# Altium footprint library Conectores GAM.PcbLib: 182 footprints (part 3 of 12)
Each footprint in its own frame and in the unit in brackets; x right, y up, seen from the top. Pads: shape width x height; smd on the part's side, far side on the other; paste and mask are expansions set on the pad; w line width, h text height; cw(c..) or ccw(c..) is an arc to the next point about the centre after c.
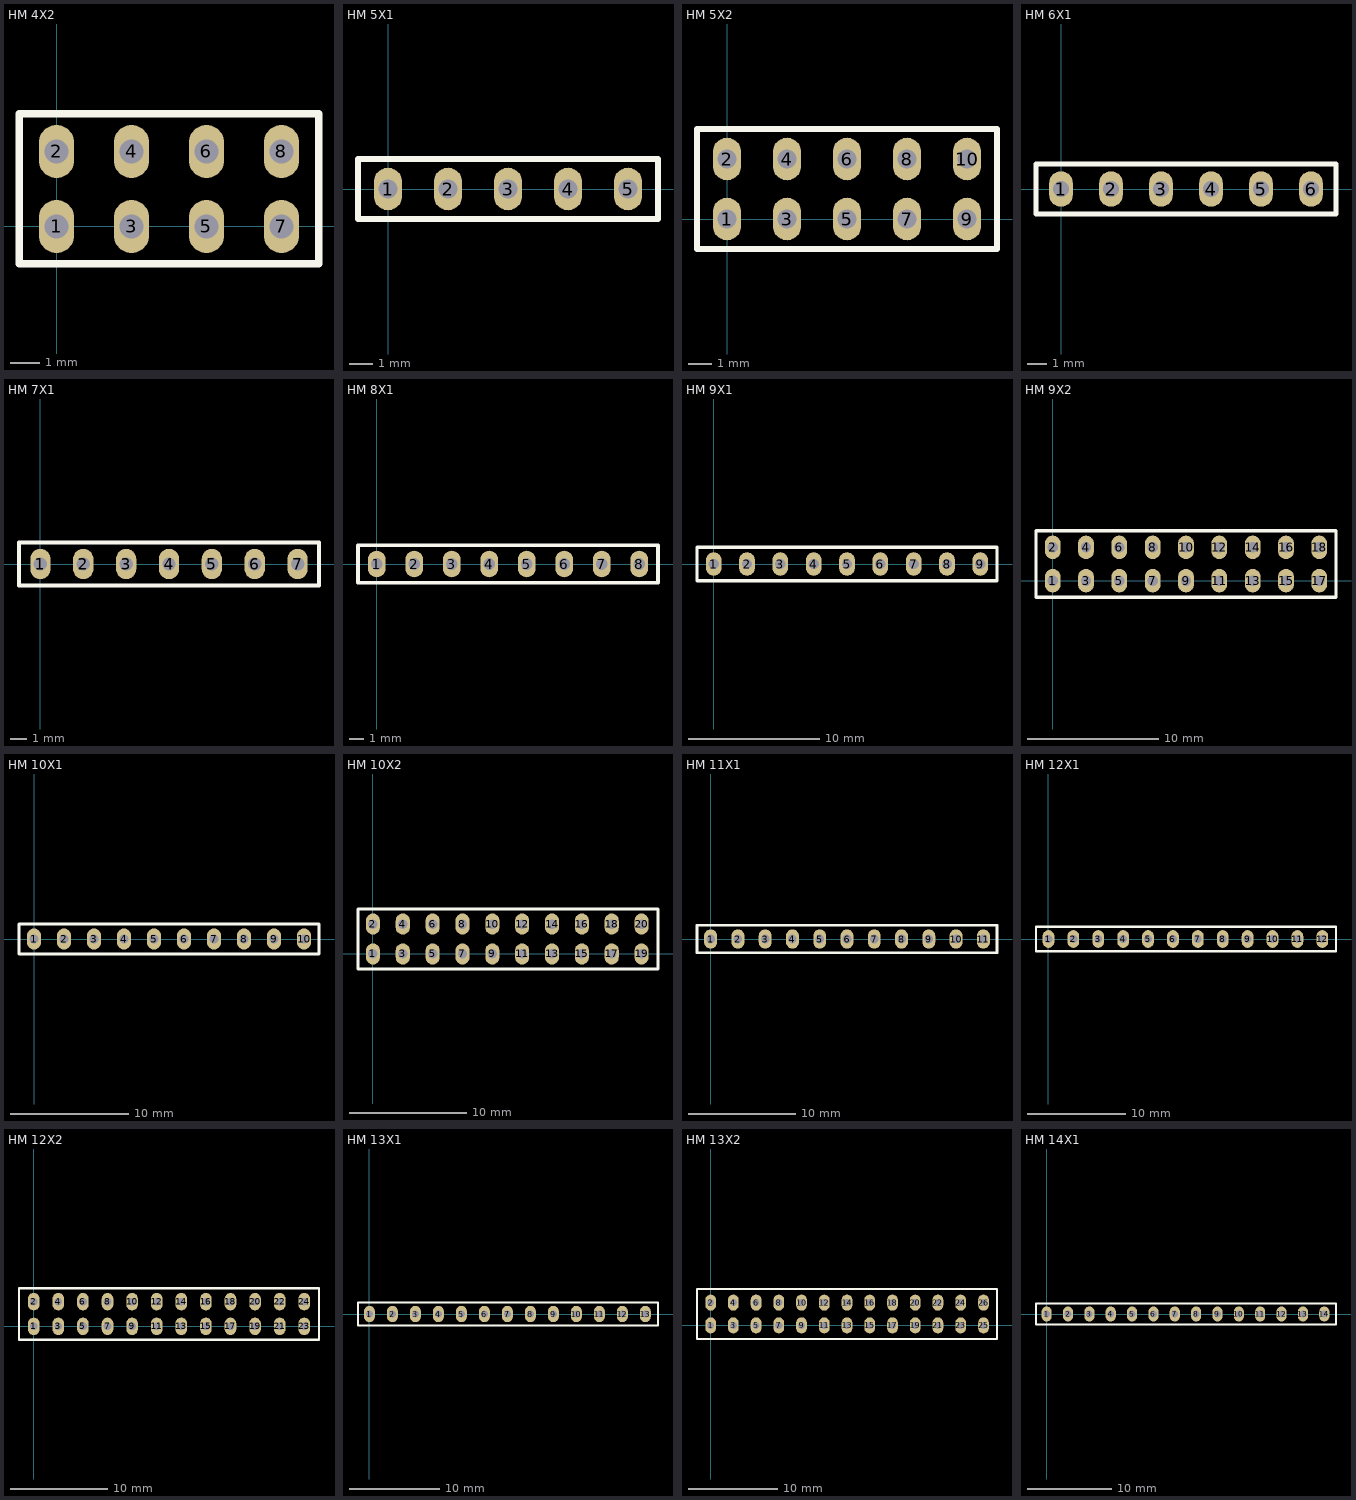
[diagram p2: the footprints below, top view; thin cyan lines are the x and y axes]

## HM 4X2 [mm] "Header Macho 4x2 2.54mm"
pads (8):
  oval 1.2x1.8 hole 0.8: 1(0,0) 2(0,2.54) 3(2.54,0) 4(2.54,2.54) 5(5.08,0) 6(5.08,2.54) 7(7.62,0) 8(7.62,2.54)
Top Overlay:
  lines w0.254: -1.27,-1.27 -1.27,1.27 -1.27,3.81 8.89,3.81 8.89,1.27 8.89,-1.27 -1.27,-1.27
3D body "Header_Male_1Pin.STEP": height 8.54, standoff -3, extent -1.27,-1.245 1.27,1.245
3D body "Header_Male_1Pin.STEP": height 8.54, standoff -3, extent 1.27,-1.245 3.81,1.245
3D body "Header_Male_1Pin.STEP": height 8.54, standoff -3, extent 3.81,-1.245 6.35,1.245
3D body "Header_Male_1Pin.STEP": height 8.54, standoff -3, extent 6.35,-1.245 8.89,1.245
3D body "Header_Male_1Pin.STEP": height 8.54, standoff -3, extent 6.35,1.295 8.89,3.785
3D body "Header_Male_1Pin.STEP": height 8.54, standoff -3, extent 3.81,1.295 6.35,3.785
3D body "Header_Male_1Pin.STEP": height 8.54, standoff -3, extent 1.27,1.295 3.81,3.785
3D body "Header_Male_1Pin.STEP": height 8.54, standoff -3, extent -1.27,1.295 1.27,3.785

## HM 5X1 [mm] "Header Macho 5x1 2.54mm"
pads (5):
  oval 1.2x1.8 hole 0.8: 1(0,0) 2(2.54,0) 3(5.08,0) 4(7.62,0) 5(10.16,0)
Top Overlay:
  lines w0.254: -1.27,-1.27 -1.27,1.27 11.43,1.27 11.43,-1.27 -1.27,-1.27
3D body "Header_Male_1Pin.STEP": height 8.54, standoff -3, extent -1.27,-1.245 1.27,1.245
3D body "Header_Male_1Pin.STEP": height 8.54, standoff -3, extent 1.27,-1.245 3.81,1.245
3D body "Header_Male_1Pin.STEP": height 8.54, standoff -3, extent 3.81,-1.245 6.35,1.245
3D body "Header_Male_1Pin.STEP": height 8.54, standoff -3, extent 6.35,-1.245 8.89,1.245
3D body "Header_Male_1Pin.STEP": height 8.54, standoff -3, extent 8.89,-1.245 11.43,1.245

## HM 5X2 [mm] "Header Macho 5x2 2.54mm"
pads (10):
  oval 1.2x1.8 hole 0.8: 1(0,0) 2(0,2.54) 3(2.54,0) 4(2.54,2.54) 5(5.08,0) 6(5.08,2.54) 7(7.62,0) 8(7.62,2.54) 9(10.16,0) 10(10.16,2.54)
Top Overlay:
  lines w0.254: -1.27,-1.27 11.43,-1.27 11.43,1.27 11.43,3.81 -1.27,3.81 -1.27,1.27 -1.27,-1.27
3D body "Header_Male_1Pin.STEP": height 8.54, standoff -3, extent 8.89,-1.245 11.43,1.245
3D body "Header_Male_1Pin.STEP": height 8.54, standoff -3, extent 6.35,-1.245 8.89,1.245
3D body "Header_Male_1Pin.STEP": height 8.54, standoff -3, extent 3.81,-1.245 6.35,1.245
3D body "Header_Male_1Pin.STEP": height 8.54, standoff -3, extent 1.27,-1.245 3.81,1.245
3D body "Header_Male_1Pin.STEP": height 8.54, standoff -3, extent -1.27,-1.245 1.27,1.245
3D body "Header_Male_1Pin.STEP": height 8.54, standoff -3, extent -1.27,1.295 1.27,3.785
3D body "Header_Male_1Pin.STEP": height 8.54, standoff -3, extent 1.27,1.295 3.81,3.785
3D body "Header_Male_1Pin.STEP": height 8.54, standoff -3, extent 3.81,1.295 6.35,3.785
3D body "Header_Male_1Pin.STEP": height 8.54, standoff -3, extent 6.35,1.295 8.89,3.785
3D body "Header_Male_1Pin.STEP": height 8.54, standoff -3, extent 8.89,1.295 11.43,3.785

## HM 6X1 [mm] "Header Macho 6x1 2.54mm"
pads (6):
  oval 1.2x1.8 hole 0.8: 1(0,0) 2(2.54,0) 3(5.08,0) 4(7.62,0) 5(10.16,0) 6(12.7,0)
Top Overlay:
  lines w0.254: -1.27,-1.27 -1.27,1.27 13.97,1.27 13.97,-1.27 -1.27,-1.27
3D body "Header_Male_1Pin.STEP": height 8.54, standoff -3, extent -1.27,-1.245 1.27,1.245
3D body "Header_Male_1Pin.STEP": height 8.54, standoff -3, extent 1.27,-1.245 3.81,1.245
3D body "Header_Male_1Pin.STEP": height 8.54, standoff -3, extent 3.81,-1.245 6.35,1.245
3D body "Header_Male_1Pin.STEP": height 8.54, standoff -3, extent 6.35,-1.245 8.89,1.245
3D body "Header_Male_1Pin.STEP": height 8.54, standoff -3, extent 8.89,-1.245 11.43,1.245
3D body "Header_Male_1Pin.STEP": height 8.54, standoff -3, extent 11.43,-1.245 13.97,1.245

## HM 7X1 [mm] "Header Macho 7x1 2.54mm"
pads (7):
  oval 1.2x1.8 hole 0.8: 1(0,0) 2(2.54,0) 3(5.08,0) 4(7.62,0) 5(10.16,0) 6(12.7,0) 7(15.24,0)
Top Overlay:
  lines w0.254: -1.27,-1.27 16.51,-1.27 16.51,1.27 -1.27,1.27 -1.27,-1.27
3D body "Header_Male_1Pin.STEP": height 8.54, standoff -3, extent 13.97,-1.245 16.51,1.245
3D body "Header_Male_1Pin.STEP": height 8.54, standoff -3, extent 11.43,-1.245 13.97,1.245
3D body "Header_Male_1Pin.STEP": height 8.54, standoff -3, extent 8.89,-1.245 11.43,1.245
3D body "Header_Male_1Pin.STEP": height 8.54, standoff -3, extent 6.35,-1.245 8.89,1.245
3D body "Header_Male_1Pin.STEP": height 8.54, standoff -3, extent 3.81,-1.245 6.35,1.245
3D body "Header_Male_1Pin.STEP": height 8.54, standoff -3, extent 1.27,-1.245 3.81,1.245
3D body "Header_Male_1Pin.STEP": height 8.54, standoff -3, extent -1.27,-1.245 1.27,1.245

## HM 8X1 [mm] "Header Macho 8x1 2.54mm"
pads (8):
  oval 1.2x1.8 hole 0.8: 1(0,0) 2(2.54,0) 3(5.08,0) 4(7.62,0) 5(10.16,0) 6(12.7,0) 7(15.24,0) 8(17.78,0)
Top Overlay:
  lines w0.254: -1.27,-1.27 19.05,-1.27 19.05,1.27 -1.27,1.27 -1.27,-1.27
3D body "Header_Male_1Pin.STEP": height 8.54, standoff -3, extent 16.51,-1.245 19.05,1.245
3D body "Header_Male_1Pin.STEP": height 8.54, standoff -3, extent 13.97,-1.245 16.51,1.245
3D body "Header_Male_1Pin.STEP": height 8.54, standoff -3, extent 11.43,-1.245 13.97,1.245
3D body "Header_Male_1Pin.STEP": height 8.54, standoff -3, extent 8.89,-1.245 11.43,1.245
3D body "Header_Male_1Pin.STEP": height 8.54, standoff -3, extent 6.35,-1.245 8.89,1.245
3D body "Header_Male_1Pin.STEP": height 8.54, standoff -3, extent 3.81,-1.245 6.35,1.245
3D body "Header_Male_1Pin.STEP": height 8.54, standoff -3, extent 1.27,-1.245 3.81,1.245
3D body "Header_Male_1Pin.STEP": height 8.54, standoff -3, extent -1.27,-1.245 1.27,1.245

## HM 9X1 [mm] "Header Macho 9x1 2.54mm"
pads (9):
  oval 1.2x1.8 hole 0.8: 1(0,0) 2(2.54,0) 3(5.08,0) 4(7.62,0) 5(10.16,0) 6(12.7,0) 7(15.24,0) 8(17.78,0) 9(20.32,0)
Top Overlay:
  lines w0.254: -1.27,-1.27 21.59,-1.27 21.59,1.27 -1.27,1.27 -1.27,-1.27
3D body "Header_Male_1Pin.STEP": height 8.54, standoff -3, extent 19.05,-1.245 21.59,1.245
3D body "Header_Male_1Pin.STEP": height 8.54, standoff -3, extent 16.51,-1.245 19.05,1.245
3D body "Header_Male_1Pin.STEP": height 8.54, standoff -3, extent 13.97,-1.245 16.51,1.245
3D body "Header_Male_1Pin.STEP": height 8.54, standoff -3, extent 11.43,-1.245 13.97,1.245
3D body "Header_Male_1Pin.STEP": height 8.54, standoff -3, extent 8.89,-1.245 11.43,1.245
3D body "Header_Male_1Pin.STEP": height 8.54, standoff -3, extent 6.35,-1.245 8.89,1.245
3D body "Header_Male_1Pin.STEP": height 8.54, standoff -3, extent 3.81,-1.245 6.35,1.245
3D body "Header_Male_1Pin.STEP": height 8.54, standoff -3, extent 1.27,-1.245 3.81,1.245
3D body "Header_Male_1Pin.STEP": height 8.54, standoff -3, extent -1.27,-1.245 1.27,1.245

## HM 9X2 [mm] "Header Macho 9x2 2.54mm"
pads (18):
  oval 1.2x1.8 hole 0.8: 1(0,0) 2(0,2.54) 3(2.54,0) 4(2.54,2.54) 5(5.08,0) 6(5.08,2.54) 7(7.62,0) 8(7.62,2.54) 9(10.16,0) 10(10.16,2.54) 11(12.7,0) 12(12.7,2.54) 13(15.24,0) 14(15.24,2.54) 15(17.78,0) 16(17.78,2.54) 17(20.32,0) 18(20.32,2.54)
Top Overlay:
  lines w0.254: -1.27,-1.27 -1.27,1.27 -1.27,3.81 21.59,3.81 21.59,1.27 21.59,-1.27 -1.27,-1.27
3D body "Header_Male_1Pin.STEP": height 8.54, standoff -3, extent 19.05,1.295 21.59,3.785
3D body "Header_Male_1Pin.STEP": height 8.54, standoff -3, extent 16.51,1.295 19.05,3.785
3D body "Header_Male_1Pin.STEP": height 8.54, standoff -3, extent 13.97,1.295 16.51,3.785
3D body "Header_Male_1Pin.STEP": height 8.54, standoff -3, extent 11.43,1.295 13.97,3.785
3D body "Header_Male_1Pin.STEP": height 8.54, standoff -3, extent 8.89,1.295 11.43,3.785
3D body "Header_Male_1Pin.STEP": height 8.54, standoff -3, extent 6.35,1.295 8.89,3.785
3D body "Header_Male_1Pin.STEP": height 8.54, standoff -3, extent 3.81,1.295 6.35,3.785
3D body "Header_Male_1Pin.STEP": height 8.54, standoff -3, extent 1.27,1.295 3.81,3.785
3D body "Header_Male_1Pin.STEP": height 8.54, standoff -3, extent -1.27,1.295 1.27,3.785
3D body "Header_Male_1Pin.STEP": height 8.54, standoff -3, extent -1.27,-1.245 1.27,1.245
3D body "Header_Male_1Pin.STEP": height 8.54, standoff -3, extent 1.27,-1.245 3.81,1.245
3D body "Header_Male_1Pin.STEP": height 8.54, standoff -3, extent 3.81,-1.245 6.35,1.245
3D body "Header_Male_1Pin.STEP": height 8.54, standoff -3, extent 6.35,-1.245 8.89,1.245
3D body "Header_Male_1Pin.STEP": height 8.54, standoff -3, extent 8.89,-1.245 11.43,1.245
3D body "Header_Male_1Pin.STEP": height 8.54, standoff -3, extent 11.43,-1.245 13.97,1.245
3D body "Header_Male_1Pin.STEP": height 8.54, standoff -3, extent 13.97,-1.245 16.51,1.245
3D body "Header_Male_1Pin.STEP": height 8.54, standoff -3, extent 16.51,-1.245 19.05,1.245
3D body "Header_Male_1Pin.STEP": height 8.54, standoff -3, extent 19.05,-1.245 21.59,1.245

## HM 10X1 [mm] "HM 10X1 2.54mm"
pads (10):
  oval 1.2x1.8 hole 0.8: 1(0,0) 2(2.54,0) 3(5.08,0) 4(7.62,0) 5(10.16,0) 6(12.7,0) 7(15.24,0) 8(17.78,0) 9(20.32,0) 10(22.86,0)
Top Overlay:
  lines w0.254: -1.27,-1.27 -1.27,1.27 24.13,1.27 24.13,-1.27 -1.27,-1.27
3D body "Header_Male_1Pin.STEP": height 8.54, standoff -3, extent -1.27,-1.245 1.27,1.245
3D body "Header_Male_1Pin.STEP": height 8.54, standoff -3, extent 1.27,-1.245 3.81,1.245
3D body "Header_Male_1Pin.STEP": height 8.54, standoff -3, extent 3.81,-1.245 6.35,1.245
3D body "Header_Male_1Pin.STEP": height 8.54, standoff -3, extent 6.35,-1.245 8.89,1.245
3D body "Header_Male_1Pin.STEP": height 8.54, standoff -3, extent 8.89,-1.245 11.43,1.245
3D body "Header_Male_1Pin.STEP": height 8.54, standoff -3, extent 11.43,-1.245 13.97,1.245
3D body "Header_Male_1Pin.STEP": height 8.54, standoff -3, extent 13.97,-1.245 16.51,1.245
3D body "Header_Male_1Pin.STEP": height 8.54, standoff -3, extent 16.51,-1.245 19.05,1.245
3D body "Header_Male_1Pin.STEP": height 8.54, standoff -3, extent 19.05,-1.245 21.59,1.245
3D body "Header_Male_1Pin.STEP": height 8.54, standoff -3, extent 21.59,-1.245 24.13,1.245

## HM 10X2 [mm] "HM 10X2 2.54mm"
pads (20):
  oval 1.2x1.8 hole 0.8: 1(0,0) 2(0,2.54) 3(2.54,0) 4(2.54,2.54) 5(5.08,0) 6(5.08,2.54) 7(7.62,0) 8(7.62,2.54) 9(10.16,0) 10(10.16,2.54) 11(12.7,0) 12(12.7,2.54) 13(15.24,0) 14(15.24,2.54) 15(17.78,0) 16(17.78,2.54) 17(20.32,0) 18(20.32,2.54) 19(22.86,0) 20(22.86,2.54)
Top Overlay:
  lines w0.254: -1.27,-1.27 -1.27,3.81 24.257,3.81 24.257,-1.27 -1.27,-1.27
3D body "Header_Male_1Pin.STEP": height 8.54, standoff -3, extent -1.27,-1.245 1.27,1.245
3D body "Header_Male_1Pin.STEP": height 8.54, standoff -3, extent 1.27,-1.245 3.81,1.245
3D body "Header_Male_1Pin.STEP": height 8.54, standoff -3, extent 3.81,-1.245 6.35,1.245
3D body "Header_Male_1Pin.STEP": height 8.54, standoff -3, extent 6.35,-1.245 8.89,1.245
3D body "Header_Male_1Pin.STEP": height 8.54, standoff -3, extent 8.89,-1.245 11.43,1.245
3D body "Header_Male_1Pin.STEP": height 8.54, standoff -3, extent 11.43,-1.245 13.97,1.245
3D body "Header_Male_1Pin.STEP": height 8.54, standoff -3, extent 13.97,-1.245 16.51,1.245
3D body "Header_Male_1Pin.STEP": height 8.54, standoff -3, extent 16.51,-1.245 19.05,1.245
3D body "Header_Male_1Pin.STEP": height 8.54, standoff -3, extent 19.05,-1.245 21.59,1.245
3D body "Header_Male_1Pin.STEP": height 8.54, standoff -3, extent 21.59,-1.245 24.13,1.245
3D body "Header_Male_1Pin.STEP": height 8.54, standoff -3, extent 21.59,1.295 24.13,3.785
3D body "Header_Male_1Pin.STEP": height 8.54, standoff -3, extent 19.05,1.295 21.59,3.785
3D body "Header_Male_1Pin.STEP": height 8.54, standoff -3, extent 16.51,1.295 19.05,3.785
3D body "Header_Male_1Pin.STEP": height 8.54, standoff -3, extent 13.97,1.295 16.51,3.785
3D body "Header_Male_1Pin.STEP": height 8.54, standoff -3, extent 11.43,1.295 13.97,3.785
3D body "Header_Male_1Pin.STEP": height 8.54, standoff -3, extent 8.89,1.295 11.43,3.785
3D body "Header_Male_1Pin.STEP": height 8.54, standoff -3, extent 6.35,1.295 8.89,3.785
3D body "Header_Male_1Pin.STEP": height 8.54, standoff -3, extent 3.81,1.295 6.35,3.785
3D body "Header_Male_1Pin.STEP": height 8.54, standoff -3, extent 1.27,1.295 3.81,3.785
3D body "Header_Male_1Pin.STEP": height 8.54, standoff -3, extent -1.27,1.295 1.27,3.785

## HM 11X1 [mm] "Header Macho 11x1 2.54mm"
pads (11):
  oval 1.2x1.8 hole 0.8: 1(0,0) 2(2.54,0) 3(5.08,0) 4(7.62,0) 5(10.16,0) 6(12.7,0) 7(15.24,0) 8(17.78,0) 9(20.32,0) 10(22.86,0) 11(25.4,0)
Top Overlay:
  lines w0.254: -1.27,-1.27 26.67,-1.27 26.67,1.27 -1.27,1.27 -1.27,-1.27
3D body "Header_Male_1Pin.STEP": height 8.54, standoff -3, extent 21.59,-1.245 24.13,1.245
3D body "Header_Male_1Pin.STEP": height 8.54, standoff -3, extent 19.05,-1.245 21.59,1.245
3D body "Header_Male_1Pin.STEP": height 8.54, standoff -3, extent 16.51,-1.245 19.05,1.245
3D body "Header_Male_1Pin.STEP": height 8.54, standoff -3, extent 13.97,-1.245 16.51,1.245
3D body "Header_Male_1Pin.STEP": height 8.54, standoff -3, extent 11.43,-1.245 13.97,1.245
3D body "Header_Male_1Pin.STEP": height 8.54, standoff -3, extent 8.89,-1.245 11.43,1.245
3D body "Header_Male_1Pin.STEP": height 8.54, standoff -3, extent 6.35,-1.245 8.89,1.245
3D body "Header_Male_1Pin.STEP": height 8.54, standoff -3, extent 3.81,-1.245 6.35,1.245
3D body "Header_Male_1Pin.STEP": height 8.54, standoff -3, extent 1.27,-1.245 3.81,1.245
3D body "Header_Male_1Pin.STEP": height 8.54, standoff -3, extent -1.27,-1.245 1.27,1.245
3D body "Header_Male_1Pin.STEP": height 8.54, standoff -3, extent 24.13,-1.245 26.67,1.245

## HM 12X1 [mm] "Header Macho 12x1 2.54mm"
pads (12):
  oval 1.2x1.8 hole 0.8: 1(0,0) 2(2.54,0) 3(5.08,0) 4(7.62,0) 5(10.16,0) 6(12.7,0) 7(15.24,0) 8(17.78,0) 9(20.32,0) 10(22.86,0) 11(25.4,0) 12(27.94,0)
Top Overlay:
  lines w0.254: -1.27,-1.27 29.337,-1.27 29.337,1.27 -1.27,1.27 -1.27,-1.27
3D body "Header_Male_1Pin.STEP": height 8.54, standoff -3, extent 26.67,-1.245 29.21,1.245
3D body "Header_Male_1Pin.STEP": height 8.54, standoff -3, extent 21.59,-1.245 24.13,1.245
3D body "Header_Male_1Pin.STEP": height 8.54, standoff -3, extent 19.05,-1.245 21.59,1.245
3D body "Header_Male_1Pin.STEP": height 8.54, standoff -3, extent 16.51,-1.245 19.05,1.245
3D body "Header_Male_1Pin.STEP": height 8.54, standoff -3, extent 13.97,-1.245 16.51,1.245
3D body "Header_Male_1Pin.STEP": height 8.54, standoff -3, extent 11.43,-1.245 13.97,1.245
3D body "Header_Male_1Pin.STEP": height 8.54, standoff -3, extent 8.89,-1.245 11.43,1.245
3D body "Header_Male_1Pin.STEP": height 8.54, standoff -3, extent 6.35,-1.245 8.89,1.245
3D body "Header_Male_1Pin.STEP": height 8.54, standoff -3, extent 3.81,-1.245 6.35,1.245
3D body "Header_Male_1Pin.STEP": height 8.54, standoff -3, extent 1.27,-1.245 3.81,1.245
3D body "Header_Male_1Pin.STEP": height 8.54, standoff -3, extent -1.27,-1.245 1.27,1.245
3D body "Header_Male_1Pin.STEP": height 8.54, standoff -3, extent 24.13,-1.245 26.67,1.245

## HM 12X2 [mm] "HM 12X2 2.54mm"
pads (24):
  oval 1.2x1.8 hole 0.8: 1(0,0) 2(0,2.54) 3(2.54,0) 4(2.54,2.54) 5(5.08,0) 6(5.08,2.54) 7(7.62,0) 8(7.62,2.54) 9(10.16,0) 10(10.16,2.54) 11(12.7,0) 12(12.7,2.54) 13(15.24,0) 14(15.24,2.54) 15(17.78,0) 16(17.78,2.54) 17(20.32,0) 18(20.32,2.54) 19(22.86,0) 20(22.86,2.54) 21(25.4,0) 22(25.4,2.54) 23(27.94,0) 24(27.94,2.54)
Top Overlay:
  lines w0.254: -1.524,-1.397 29.464,-1.397 29.464,3.937 -1.524,3.937 -1.524,-1.397
3D body "Header_Male_1Pin.STEP": height 8.54, standoff -3, extent 24.13,1.295 26.67,3.785
3D body "Header_Male_1Pin.STEP": height 8.54, standoff -3, extent 24.13,-1.245 26.67,1.245
3D body "Header_Male_1Pin.STEP": height 8.54, standoff -3, extent 26.67,1.295 29.21,3.785
3D body "Header_Male_1Pin.STEP": height 8.54, standoff -3, extent 26.67,-1.245 29.21,1.245
3D body "Header_Male_1Pin.STEP": height 8.54, standoff -3, extent -1.27,1.295 1.27,3.785
3D body "Header_Male_1Pin.STEP": height 8.54, standoff -3, extent 1.27,1.295 3.81,3.785
3D body "Header_Male_1Pin.STEP": height 8.54, standoff -3, extent 3.81,1.295 6.35,3.785
3D body "Header_Male_1Pin.STEP": height 8.54, standoff -3, extent 6.35,1.295 8.89,3.785
3D body "Header_Male_1Pin.STEP": height 8.54, standoff -3, extent 8.89,1.295 11.43,3.785
3D body "Header_Male_1Pin.STEP": height 8.54, standoff -3, extent 11.43,1.295 13.97,3.785
3D body "Header_Male_1Pin.STEP": height 8.54, standoff -3, extent 13.97,1.295 16.51,3.785
3D body "Header_Male_1Pin.STEP": height 8.54, standoff -3, extent 16.51,1.295 19.05,3.785
3D body "Header_Male_1Pin.STEP": height 8.54, standoff -3, extent 19.05,1.295 21.59,3.785
3D body "Header_Male_1Pin.STEP": height 8.54, standoff -3, extent 21.59,1.295 24.13,3.785
3D body "Header_Male_1Pin.STEP": height 8.54, standoff -3, extent 21.59,-1.245 24.13,1.245
3D body "Header_Male_1Pin.STEP": height 8.54, standoff -3, extent 19.05,-1.245 21.59,1.245
3D body "Header_Male_1Pin.STEP": height 8.54, standoff -3, extent 16.51,-1.245 19.05,1.245
3D body "Header_Male_1Pin.STEP": height 8.54, standoff -3, extent 13.97,-1.245 16.51,1.245
3D body "Header_Male_1Pin.STEP": height 8.54, standoff -3, extent 11.43,-1.245 13.97,1.245
3D body "Header_Male_1Pin.STEP": height 8.54, standoff -3, extent 8.89,-1.245 11.43,1.245
3D body "Header_Male_1Pin.STEP": height 8.54, standoff -3, extent 6.35,-1.245 8.89,1.245
3D body "Header_Male_1Pin.STEP": height 8.54, standoff -3, extent 3.81,-1.245 6.35,1.245
3D body "Header_Male_1Pin.STEP": height 8.54, standoff -3, extent 1.27,-1.245 3.81,1.245
3D body "Header_Male_1Pin.STEP": height 8.54, standoff -3, extent -1.27,-1.245 1.27,1.245

## HM 13X1 [mm] "Header Macho 13x1 2.54mm"
pads (13):
  oval 1.2x1.8 hole 0.8: 1(0,0) 2(2.54,0) 3(5.08,0) 4(7.62,0) 5(10.16,0) 6(12.7,0) 7(15.24,0) 8(17.78,0) 9(20.32,0) 10(22.86,0) 11(25.4,0) 12(27.94,0) 13(30.48,0)
Top Overlay:
  lines w0.254: -1.27,-1.27 -1.27,1.27 31.877,1.27 31.877,-1.27 -1.27,-1.27
3D body "Header_Male_1Pin.STEP": height 8.54, standoff -3, extent 29.21,-1.245 31.75,1.245
3D body "Header_Male_1Pin.STEP": height 8.54, standoff -3, extent 24.13,-1.245 26.67,1.245
3D body "Header_Male_1Pin.STEP": height 8.54, standoff -3, extent -1.27,-1.245 1.27,1.245
3D body "Header_Male_1Pin.STEP": height 8.54, standoff -3, extent 1.27,-1.245 3.81,1.245
3D body "Header_Male_1Pin.STEP": height 8.54, standoff -3, extent 3.81,-1.245 6.35,1.245
3D body "Header_Male_1Pin.STEP": height 8.54, standoff -3, extent 6.35,-1.245 8.89,1.245
3D body "Header_Male_1Pin.STEP": height 8.54, standoff -3, extent 8.89,-1.245 11.43,1.245
3D body "Header_Male_1Pin.STEP": height 8.54, standoff -3, extent 11.43,-1.245 13.97,1.245
3D body "Header_Male_1Pin.STEP": height 8.54, standoff -3, extent 13.97,-1.245 16.51,1.245
3D body "Header_Male_1Pin.STEP": height 8.54, standoff -3, extent 16.51,-1.245 19.05,1.245
3D body "Header_Male_1Pin.STEP": height 8.54, standoff -3, extent 19.05,-1.245 21.59,1.245
3D body "Header_Male_1Pin.STEP": height 8.54, standoff -3, extent 21.59,-1.245 24.13,1.245
3D body "Header_Male_1Pin.STEP": height 8.54, standoff -3, extent 26.67,-1.245 29.21,1.245

## HM 13X2 [mm] "HM 13X2 2.54mm"
pads (26):
  oval 1.2x1.8 hole 0.8: 1(0,0) 2(0,2.54) 3(2.54,0) 4(2.54,2.54) 5(5.08,0) 6(5.08,2.54) 7(7.62,0) 8(7.62,2.54) 9(10.16,0) 10(10.16,2.54) 11(12.7,0) 12(12.7,2.54) 13(15.24,0) 14(15.24,2.54) 15(17.78,0) 16(17.78,2.54) 17(20.32,0) 18(20.32,2.54) 19(22.86,0) 20(22.86,2.54) 21(25.4,0) 22(25.4,2.54) 23(27.94,0) 24(27.94,2.54) 25(30.499,0) 26(30.499,2.54)
Top Overlay:
  lines w0.254: -1.524,-1.524 32.004,-1.524 32.004,4.064 -1.524,4.064 -1.524,-1.524
3D body "Header_Male_1Pin.STEP": height 8.54, standoff -3, extent 29.229,1.295 31.769,3.785
3D body "Header_Male_1Pin.STEP": height 8.54, standoff -3, extent 29.229,-1.245 31.769,1.245
3D body "Header_Male_1Pin.STEP": height 8.54, standoff -3, extent 24.13,1.295 26.67,3.785
3D body "Header_Male_1Pin.STEP": height 8.54, standoff -3, extent 24.13,-1.245 26.67,1.245
3D body "Header_Male_1Pin.STEP": height 8.54, standoff -3, extent 26.67,1.295 29.21,3.785
3D body "Header_Male_1Pin.STEP": height 8.54, standoff -3, extent 26.67,-1.245 29.21,1.245
3D body "Header_Male_1Pin.STEP": height 8.54, standoff -3, extent -1.27,1.295 1.27,3.785
3D body "Header_Male_1Pin.STEP": height 8.54, standoff -3, extent 1.27,1.295 3.81,3.785
3D body "Header_Male_1Pin.STEP": height 8.54, standoff -3, extent 3.81,1.295 6.35,3.785
3D body "Header_Male_1Pin.STEP": height 8.54, standoff -3, extent 6.35,1.295 8.89,3.785
3D body "Header_Male_1Pin.STEP": height 8.54, standoff -3, extent 8.89,1.295 11.43,3.785
3D body "Header_Male_1Pin.STEP": height 8.54, standoff -3, extent 11.43,1.295 13.97,3.785
3D body "Header_Male_1Pin.STEP": height 8.54, standoff -3, extent 13.97,1.295 16.51,3.785
3D body "Header_Male_1Pin.STEP": height 8.54, standoff -3, extent 16.51,1.295 19.05,3.785
3D body "Header_Male_1Pin.STEP": height 8.54, standoff -3, extent 19.05,1.295 21.59,3.785
3D body "Header_Male_1Pin.STEP": height 8.54, standoff -3, extent 21.59,1.295 24.13,3.785
3D body "Header_Male_1Pin.STEP": height 8.54, standoff -3, extent 21.59,-1.245 24.13,1.245
3D body "Header_Male_1Pin.STEP": height 8.54, standoff -3, extent 19.05,-1.245 21.59,1.245
3D body "Header_Male_1Pin.STEP": height 8.54, standoff -3, extent 16.51,-1.245 19.05,1.245
3D body "Header_Male_1Pin.STEP": height 8.54, standoff -3, extent 13.97,-1.245 16.51,1.245
3D body "Header_Male_1Pin.STEP": height 8.54, standoff -3, extent 11.43,-1.245 13.97,1.245
3D body "Header_Male_1Pin.STEP": height 8.54, standoff -3, extent 8.89,-1.245 11.43,1.245
3D body "Header_Male_1Pin.STEP": height 8.54, standoff -3, extent 6.35,-1.245 8.89,1.245
3D body "Header_Male_1Pin.STEP": height 8.54, standoff -3, extent 3.81,-1.245 6.35,1.245
3D body "Header_Male_1Pin.STEP": height 8.54, standoff -3, extent 1.27,-1.245 3.81,1.245
3D body "Header_Male_1Pin.STEP": height 8.54, standoff -3, extent -1.27,-1.245 1.27,1.245

## HM 14X1 [mm] "Header Macho 14x1 2.54mm"
pads (14):
  oval 1.2x1.8 hole 0.8: 1(0,0) 2(2.54,0) 3(5.08,0) 4(7.62,0) 5(10.16,0) 6(12.7,0) 7(15.24,0) 8(17.78,0) 9(20.32,0) 10(22.86,0) 11(25.4,0) 12(27.94,0) 13(30.48,0) 14(33.02,0)
Top Overlay:
  lines w0.254: -1.27,-1.27 -1.27,1.27 34.417,1.27 34.417,-1.27 -1.27,-1.27
3D body "Header_Male_1Pin.STEP": height 8.54, standoff -3, extent 31.75,-1.245 34.29,1.245
3D body "Header_Male_1Pin.STEP": height 8.54, standoff -3, extent 29.21,-1.245 31.75,1.245
3D body "Header_Male_1Pin.STEP": height 8.54, standoff -3, extent 24.13,-1.245 26.67,1.245
3D body "Header_Male_1Pin.STEP": height 8.54, standoff -3, extent -1.27,-1.245 1.27,1.245
3D body "Header_Male_1Pin.STEP": height 8.54, standoff -3, extent 1.27,-1.245 3.81,1.245
3D body "Header_Male_1Pin.STEP": height 8.54, standoff -3, extent 3.81,-1.245 6.35,1.245
3D body "Header_Male_1Pin.STEP": height 8.54, standoff -3, extent 6.35,-1.245 8.89,1.245
3D body "Header_Male_1Pin.STEP": height 8.54, standoff -3, extent 8.89,-1.245 11.43,1.245
3D body "Header_Male_1Pin.STEP": height 8.54, standoff -3, extent 11.43,-1.245 13.97,1.245
3D body "Header_Male_1Pin.STEP": height 8.54, standoff -3, extent 13.97,-1.245 16.51,1.245
3D body "Header_Male_1Pin.STEP": height 8.54, standoff -3, extent 16.51,-1.245 19.05,1.245
3D body "Header_Male_1Pin.STEP": height 8.54, standoff -3, extent 19.05,-1.245 21.59,1.245
3D body "Header_Male_1Pin.STEP": height 8.54, standoff -3, extent 21.59,-1.245 24.13,1.245
3D body "Header_Male_1Pin.STEP": height 8.54, standoff -3, extent 26.67,-1.245 29.21,1.245